# Altium footprint library Item_pcb.PcbLib: 282 footprints (part 10 of 18)
Each footprint in its own frame and in the unit in brackets; x right, y up, seen from the top. Pads: shape width x height; smd on the part's side, far side on the other; paste and mask are expansions set on the pad; w line width, h text height; cw(c..) or ccw(c..) is an arc to the next point about the centre after c.
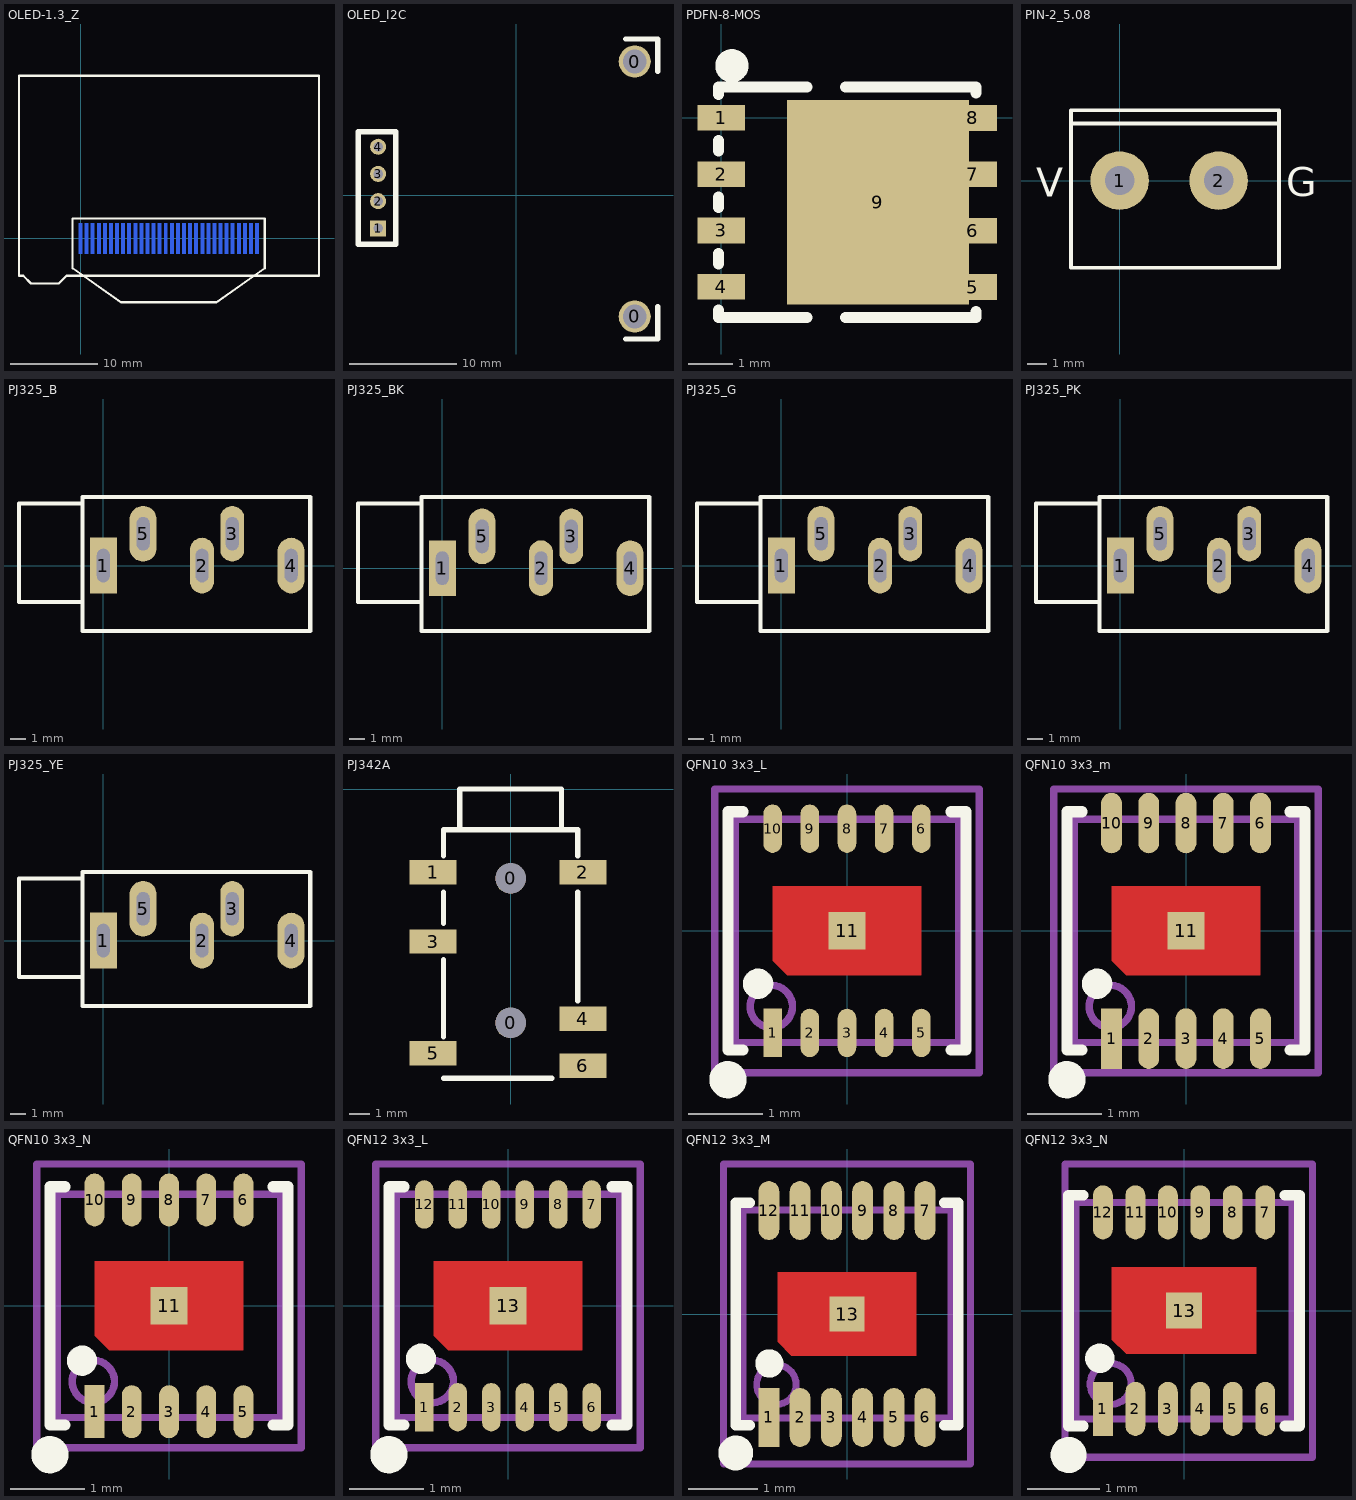
[diagram p9: the footprints below, top view; thin cyan lines are the x and y axes]

## OLED-1.3_Z [mm]
pads (30):
  rect 0.4x3.5 smd far side: 1(0,0) 2(0.7,0) 3(1.4,0) 4(2.1,0) 5(2.8,0) 6(3.5,0) 7(4.2,0) 8(4.9,0) 9(5.6,0) 10(6.3,0) 11(7,0) 12(7.7,0) 13(8.4,0) 14(9.1,0) 15(9.8,0) 16(10.5,0) 17(11.2,0) 18(11.9,0) 19(12.6,0) 20(13.3,0) 21(14,0) 22(14.7,0) 23(15.4,0) 24(16.1,0) 25(16.8,0) 26(17.5,0) 27(18.2,0) 28(18.9,0) 29(19.6,0) 30(20.3,0)
Top Overlay:
  lines w0.254: -7.075,-4.293 -6.573,-4.293 -5.684,-5.182 -2.509,-5.182 -1.62,-4.293 27.425,-4.293 27.425,18.722 -7.075,18.722 -7.075,-4.293 ; -0.909,-3.429 -0.909,2.286 21.189,2.286 21.189,-3.429 15.601,-7.341 4.679,-7.341 -0.909,-3.429
3D body "User Library-OLED-1_3C.step": height 4.65, standoff -0.07, extent -7.075,-7.367 27.425,18.722

## OLED_I2C [mm]
pads (6):
  round 3 hole 2.2: 0(11.072,-11.307) 0(11.072,12.493)
  rect 1.5x1.5 hole 0.9: 1(-12.881,-3.084)
  round 1.5 hole 0.9: 2(-12.881,-0.544) 3(-12.881,1.996) 4(-12.881,4.536)
Top Overlay:
  lines w0.5: 10.222,-13.407 13.222,-13.407 13.222,-10.407 ; 10.222,14.593 13.222,14.593 13.222,11.593 ; -14.731,-4.548 -11.231,-4.548 -11.231,5.952 -14.731,5.952 -14.731,-4.548
3D body "User Library-128x64I2COLEDDisplayAdafruit.step": height 13.47, standoff 2.63, extent -15.04,-12.624 12.82,14.076
3D body "Header-F-2.54X4.stp": height 8.6, standoff -3.1, extent -14.131,-4.479 -11.631,5.931

## PDFN-8-MOS [mm]
pads (9):
  rect 1.079x0.58 smd: 1(0,0) 2(0,-1.27) 3(0,-2.54) 4(0,-3.81)
  rect 1.08x0.58 smd: 5(5.669,-3.815) 6(5.669,-2.545) 7(5.669,-1.275) 8(5.669,-0.005)
  rect 4.1x4.6 smd: 9(3.53,-1.905)
Top Overlay:
  lines w0.25: -0.06,-4.334 -0.06,-4.505 1.937,-4.505 ; -0.06,-3.296 -0.06,-3.064 ; -0.06,-2.026 -0.06,-1.784 ; -0.06,-0.746 -0.06,-0.514 ; -0.06,0.524 -0.06,0.695 1.937,0.695 ; 2.802,-4.505 5.74,-4.505 5.74,-4.368 5.74,-4.405 ; 2.802,0.695 5.74,0.695 5.74,0.558 5.74,0.595
  lines w0.5: 0.24,1.295 ccw(c0.241,1.17) 0.242,1.295
Top Paste:
  region: 0.545,-3.515 0.545,-4.105 -0.545,-4.105 -0.545,-3.515
  region: 0.545,-2.245 0.545,-2.835 -0.545,-2.835 -0.545,-2.245
  region: 0.545,-0.975 0.545,-1.565 -0.545,-1.565 -0.545,-0.975
  region: 0.545,0.295 0.545,-0.295 -0.545,-0.295 -0.545,0.295
  region: 5.165,0.395 5.165,-4.205 1.475,-4.205 1.475,0.395
  region: 6.215,-3.515 6.215,-4.095 5.585,-4.095 5.585,-3.515
  region: 6.215,-2.255 6.215,-2.835 5.585,-2.835 5.585,-2.255
  region: 6.215,-0.985 6.215,-1.565 5.585,-1.565 5.585,-0.985
  region: 6.215,0.285 6.215,-0.295 5.585,-0.295 5.585,0.285

## PIN-2_5.08 [mm]
pads (2):
  round 3 hole 1.5: 1(0,0) 2(5.08,0)
Top Overlay:
  lines w0.2: -2.438,2.921 8.119,2.921 ; -2.489,-4.47 8.179,-4.47 8.179,3.607 -2.489,3.607 -2.489,-4.47
  text "V" at -4.293,-1.329 h2.54
  text "G" at 8.56,-1.289 h2.54
3D body "3A-2way.step": height 10, standoff -3, extent -2.481,-4.577 8.119,3.023

## PJ325_B [mm] "蓝色，18*8.1*12.3mm"
pads (5):
  rect 1.7x3.5 hole 0.8 slot 2.1 at 90 deg: 1(0,0)
  oval 1.5x3.5 hole 0.8 slot 2.1 at 90 deg: 2(6.2,0) 3(8.1,2)
  oval 1.7x3.5 hole 0.8 slot 2.1 at 90 deg: 4(11.8,0) 5(2.5,2)
Top Overlay:
  lines w0.254: -1.3,-2.3 -5.3,-2.3 -5.3,3.9 -1.3,3.9 ; -1.3,-4.1 13,-4.1 13,4.3 -1.3,4.3 -1.3,-4.1
3D body "PJ325_B.STEP": height 12.35, standoff -2.9, extent -5.23,-3.9 12.8,4.2

## PJ325_BK [mm] "黑色，18*8.1*12.3mm"
pads (5):
  rect 1.7x3.5 hole 0.8 slot 2.1 at 90 deg: 1(0,0)
  oval 1.5x3.5 hole 0.8 slot 2.1 at 90 deg: 2(6.2,0) 3(8.1,2)
  oval 1.7x3.5 hole 0.8 slot 2.1 at 90 deg: 4(11.8,0) 5(2.5,2)
Top Overlay:
  lines w0.254: -1.3,-2.136 -5.3,-2.136 -5.3,4.064 -1.3,4.064 ; -1.3,-3.936 13,-3.936 13,4.464 -1.3,4.464 -1.3,-3.936
3D body "PJ325_BK.STEP": height 12.35, standoff -2.9, extent -5.23,-3.9 12.8,4.2

## PJ325_G [mm] "绿色，18*8.1*12.3mm"
pads (5):
  rect 1.7x3.5 hole 0.8 slot 2.1 at 90 deg: 1(0,0)
  oval 1.5x3.5 hole 0.8 slot 2.1 at 90 deg: 2(6.2,0) 3(8.1,2)
  oval 1.7x3.5 hole 0.8 slot 2.1 at 90 deg: 4(11.8,0) 5(2.5,2)
Top Overlay:
  lines w0.254: -1.3,-2.3 -5.3,-2.3 -5.3,3.9 -1.3,3.9 ; -1.3,-4.1 -1.3,4.3 13,4.3 13,-4.1 -1.3,-4.1
3D body "PJ325_G.STEP": height 12.35, standoff -2.9, extent -5.23,-3.9 12.8,4.2

## PJ325_PK [mm] "粉色，18*8.1*12.3mm"
pads (5):
  rect 1.7x3.5 hole 0.8 slot 2.1 at 90 deg: 1(0,0)
  oval 1.5x3.5 hole 0.8 slot 2.1 at 90 deg: 2(6.2,0) 3(8.1,2)
  oval 1.7x3.5 hole 0.8 slot 2.1 at 90 deg: 4(11.8,0) 5(2.5,2)
Top Overlay:
  lines w0.254: -1.3,-2.3 -5.3,-2.3 -5.3,3.9 -1.3,3.9 ; -1.3,-4.1 13,-4.1 13,4.3 -1.3,4.3 -1.3,-4.1
3D body "PJ325_PK.STEP": height 12.35, standoff -2.9, extent -5.23,-3.9 12.8,4.2

## PJ325_YE [mm] "黄色，18*8.1*12.3mm"
pads (5):
  rect 1.7x3.5 hole 0.8 slot 2.1 at 90 deg: 1(0,0)
  oval 1.5x3.5 hole 0.8 slot 2.1 at 90 deg: 2(6.2,0) 3(8.1,2)
  oval 1.7x3.5 hole 0.8 slot 2.1 at 90 deg: 4(11.8,0) 5(2.5,2)
Top Overlay:
  lines w0.254: -1.3,-2.3 -5.3,-2.3 -5.3,3.9 -1.3,3.9 ; -1.3,-4.1 13,-4.1 13,4.3 -1.3,4.3 -1.3,-4.1
3D body "PJ325_YE.STEP": height 12.35, standoff -2.9, extent -5.23,-3.9 12.8,4.2

## PJ342A [mm] "有头"
pads (8):
  round 1.5 hole 1.5: 0(0,-11.5) 0(0,-4.4)
  rect 2.3x1.2 smd: 1(-3.81,-4.1) 2(3.556,-4.1) 3(-3.81,-7.5) 4(3.556,-11.3) 5(-3.81,-13) 6(3.556,-13.6)
Top Overlay:
  lines w0.254: -3.302,-14.224 2.032,-14.224 ; -3.302,-12.192 -3.302,-8.382 ; -3.302,-6.604 -3.302,-5.08 ; -3.302,-3.302 -3.302,-2 3.302,-2 3.302,-3.302 ; -2.5,-2 -2.5,0 2.5,0 2.5,-2 ; 3.302,-10.414 3.302,-5.08
3D body "PJ342A.STEP": height 4.7, standoff -0.6, extent -4.15,-14.1 4.15,0

## QFN10 3x3_L [mm] "10脚，长x宽x高：3x3x0.6mm，脚距：0.5mm"
pads (11):
  rect 0.25x0.65 smd: 1(-1,-1.372)
  oval 0.25x0.65 smd: 2(-0.5,-1.372) 3(0,-1.372) 4(0.5,-1.372) 5(1,-1.372) 6(1,1.372) 7(0.5,1.372) 8(0,1.372) 9(-0.5,1.372) 10(-1,1.372)
  rect 0.5x0.5 smd: 11(0,0)
Top Layer:
  region: -1,0.6 1,0.6 1,-0.6 -0.8,-0.6 -1,-0.4
Top Overlay:
  circle w0.203: c-1.194,-0.711 r0.102
  circle w0.25: c-1.6,-2 r0.125
  lines w0.15: -1.397,-1.6 -1.6,-1.6 -1.6,1.6 -1.397,1.6 ; 1.397,-1.6 1.6,-1.6 1.6,1.6 1.397,1.6
Top Solder:
  region: -1,0.6 1,0.6 1,-0.6 -0.8,-0.6 -1,-0.4
Mechanical 13:
  circle w0.1: c-1.016,-1.016 r0.284
  lines w0.1: 1.5,-1.5 -1.49,-1.5 -1.5,-1.51 -1.5,1.5 1.5,1.5 ; 1.5,-1.5 1.5,-1.5 ; 1.5,-1.5 1.5,1.5 ; 1.5,1.5 1.5,1.5
Mechanical 15:
  circle w0.05: c0,0 r0.35
  lines w0.05: -0.5,0 0.5,0 ; 0,-0.5 0,0.5
  lines w0.1: -1.778,-1.905 -1.778,1.905 1.778,1.905 1.778,-1.905 -1.778,-1.905
3D body "QFN10 3x3.STEP": height 0.63, standoff 0.01, extent -1.5,-1.52 1.5,1.52

## QFN10 3x3_m [mil] "10脚，长x宽x高：3x3x0.6mm，脚距：0.5mm"
pads (11):
  rect 11x32 smd: 1(-39.37,-57)
  oval 11x32 smd: 2(-19.68,-57) 3(0,-57) 4(19.68,-57) 5(39.37,-57) 6(39.37,57) 7(19.68,57) 8(0,57) 9(-19.68,57) 10(-39.37,57)
  rect 19.68x19.68 smd: 11(0,0)
Top Layer:
  region: -39.37,23.62 39.37,23.62 39.37,-23.62 -31.5,-23.62 -39.37,-15.75
Top Overlay:
  circle w9.84: c-62.99,-78.74 r4.92
  circle w8: c-47,-28 r4
  lines w5.91: -55,-62.99 -62.99,-62.99 -62.99,62.99 -55,62.99 ; 55,-62.99 62.99,-62.99 62.99,62.99 55,62.99
Top Solder:
  region: -39.37,23.62 39.37,23.62 39.37,-23.62 -31.5,-23.62 -39.37,-15.75
Mechanical 13:
  circle w3.94: c-40,-40 r11.18
  lines w3.94: 59.05,-59.05 59.05,59.05 ; 59.05,-59.05 59.06,-59.06 ; 59.06,-59.06 -58.66,-59.06 -59.06,-59.45 -59.06,59.06 59.05,59.06 ; 59.05,59.06 59.05,59.05
Mechanical 15:
  circle w1.97: c0,0 r13.78
  lines w1.97: -19.68,0 19.68,0 ; 0,-19.68 0,19.68
  lines w3.94: -70,-75 70,-75 70,75 -70,75 -70,-75
3D body "QFN10 3x3.STEP": height 24.8, standoff 0.39, extent -59.06,-59.85 59.05,59.84

## QFN10 3x3_N [mil] "10脚，长x宽x高：3x3x0.6mm，脚距：0.5mm"
pads (11):
  rect 10.5x28 smd: 1(-39.37,-56)
  oval 10.5x28 smd: 2(-19.68,-56) 3(0,-56) 4(19.68,-56) 5(39.37,-56) 6(39.37,56) 7(19.68,56) 8(0,56) 9(-19.68,56) 10(-39.37,56)
  rect 19.68x19.68 smd: 11(0,0)
Top Layer:
  region: -39.37,23.62 39.37,23.62 39.37,-23.62 -31.5,-23.62 -39.37,-15.75
Top Overlay:
  circle w8: c-46,-29 r4
  circle w9.84: c-62.99,-78.74 r4.92
  lines w5.91: -55,-62.99 -62.99,-62.99 -62.99,62.99 -55,62.99 ; 55,-62.99 62.99,-62.99 62.99,62.99 55,62.99
Top Solder:
  region: -39.37,23.62 39.37,23.62 39.37,-23.62 -31.5,-23.62 -39.37,-15.75
Mechanical 13:
  circle w3.94: c-40,-40 r11.18
  lines w3.94: 59.06,-59.06 -58.66,-59.06 -59.06,-59.45 -59.06,59.06 59.05,59.06 ; 59.05,-59.05 59.06,-59.06 ; 59.05,-59.05 59.05,59.05 ; 59.05,59.06 59.05,59.05
Mechanical 15:
  circle w1.97: c0,0 r13.78
  lines w1.97: -19.68,0 19.68,0 ; 0,-19.68 0,19.68
  lines w3.94: -70,-75 -70,75 70,75 70,-75 -70,-75
3D body "QFN10 3x3.STEP": height 24.8, standoff 0.39, extent -59.06,-59.85 59.05,59.84

## QFN12 3x3_L [mm] "12脚，长x宽x高：3x3x0.6mm，脚距：0.45mm"
pads (13):
  rect 0.25x0.65 smd: 1(-1.125,-1.362)
  oval 0.25x0.65 smd: 2(-0.675,-1.362) 3(-0.225,-1.362) 4(0.225,-1.362) 5(0.675,-1.362) 6(1.125,-1.362) 7(1.125,1.362) 8(0.675,1.362) 9(0.225,1.362) 10(-0.225,1.362) 11(-0.675,1.362) 12(-1.125,1.362)
  rect 0.5x0.5 smd: 13(0,0)
Top Layer:
  region: -1,0.6 1,0.6 1,-0.6 -0.8,-0.6 -1,-0.4
Top Overlay:
  circle w0.203: c-1.168,-0.711 r0.102
  circle w0.25: c-1.6,-2 r0.125
  lines w0.15: -1.397,-1.6 -1.6,-1.6 -1.6,1.6 -1.397,1.6 ; 1.397,-1.6 1.6,-1.6 1.6,1.6 1.397,1.6
Top Solder:
  region: -1,0.6 1,0.6 1,-0.6 -0.8,-0.6 -1,-0.4
Mechanical 13:
  circle w0.1: c-1.016,-1.016 r0.284
  lines w0.1: 1.5,-1.5 1.5,1.5 ; 1.5,-1.5 1.5,-1.5 ; 1.5,-1.5 -1.49,-1.5 -1.5,-1.51 -1.5,1.5 1.5,1.5 ; 1.5,1.5 1.5,1.5
Mechanical 15:
  circle w0.05: c0,0 r0.35
  lines w0.05: -0.5,0 0.5,0 ; 0,-0.5 0,0.5
  lines w0.1: -1.778,-1.905 1.778,-1.905 1.778,1.905 -1.778,1.905 -1.778,-1.905
3D body "QFN12 3x3.STEP": height 0.63, standoff 0, extent -1.5,-1.501 1.5,1.501

## QFN12 3x3_M [mm] "12脚，长x宽x高：3x3x0.6mm，脚距：0.45mm"
pads (13):
  rect 0.3x0.85 smd: 1(-1.125,-1.489)
  oval 0.3x0.85 smd: 2(-0.675,-1.489) 3(-0.225,-1.489) 4(0.225,-1.489) 5(0.675,-1.489) 6(1.125,-1.489) 7(1.125,1.489) 8(0.675,1.489) 9(0.225,1.489) 10(-0.225,1.489) 11(-0.675,1.489) 12(-1.125,1.489)
  rect 0.5x0.5 smd: 13(0,0)
Top Layer:
  region: -1,0.6 1,0.6 1,-0.6 -0.8,-0.6 -1,-0.4
Top Overlay:
  circle w0.203: c-1.118,-0.711 r0.102
  circle w0.25: c-1.6,-2 r0.125
  lines w0.15: -1.397,-1.6 -1.6,-1.6 -1.6,1.6 -1.397,1.6 ; 1.397,-1.6 1.6,-1.6 1.6,1.6 1.397,1.6
Top Solder:
  region: -1,0.6 1,0.6 1,-0.6 -0.8,-0.6 -1,-0.4
Mechanical 13:
  circle w0.1: c-1.016,-1.016 r0.284
  lines w0.1: 1.5,-1.5 -1.49,-1.5 -1.5,-1.51 -1.5,1.5 1.5,1.5 ; 1.5,-1.5 1.5,-1.5 ; 1.5,-1.5 1.5,1.5 ; 1.5,1.5 1.5,1.5
Mechanical 15:
  circle w0.05: c0,0 r0.35
  lines w0.05: -0.5,0 0.5,0 ; 0,-0.5 0,0.5
  lines w0.1: -1.778,-2.159 1.778,-2.159 1.778,2.159 -1.778,2.159 -1.778,-2.159
3D body "QFN12 3x3.STEP": height 0.63, standoff 0, extent -1.5,-1.501 1.5,1.501

## QFN12 3x3_N [mm] "12脚，长x宽x高：3x3x0.6mm，脚距：0.45mm"
pads (13):
  rect 0.275x0.75 smd: 1(-1.125,-1.362)
  oval 0.275x0.75 smd: 2(-0.675,-1.362) 3(-0.225,-1.362) 4(0.225,-1.362) 5(0.675,-1.362) 6(1.125,-1.362) 7(1.125,1.362) 8(0.675,1.362) 9(0.225,1.362) 10(-0.225,1.362) 11(-0.675,1.362) 12(-1.125,1.362)
  rect 0.5x0.5 smd: 13(0,0)
Top Layer:
  region: -1,0.6 1,0.6 1,-0.6 -0.8,-0.6 -1,-0.4
Top Overlay:
  circle w0.203: c-1.168,-0.66 r0.102
  circle w0.25: c-1.6,-2 r0.125
  lines w0.15: -1.397,-1.6 -1.6,-1.6 -1.6,1.6 -1.397,1.6 ; 1.397,-1.6 1.6,-1.6 1.6,1.6 1.397,1.6
Top Solder:
  region: -1,0.6 1,0.6 1,-0.6 -0.8,-0.6 -1,-0.4
Mechanical 13:
  circle w0.1: c-1.016,-1.016 r0.284
  lines w0.1: 1.5,-1.5 1.5,1.5 ; 1.5,-1.5 1.5,-1.5 ; 1.5,-1.5 -1.49,-1.5 -1.5,-1.51 -1.5,1.5 1.5,1.5 ; 1.5,1.5 1.5,1.5
Mechanical 15:
  circle w0.05: c0,0 r0.35
  lines w0.05: -0.5,0 0.5,0 ; 0,-0.5 0,0.5
  lines w0.1: -1.651,-2.032 1.778,-2.032 1.778,2.032 -1.651,2.032 -1.651,-2.032
3D body "QFN12 3x3.STEP": height 0.63, standoff 0, extent -1.5,-1.501 1.5,1.501